# Altium footprint library IC_SMD_QUAD.PCBLIB: 80 footprints (part 2 of 5)
Each footprint in its own frame and in the unit in brackets; x right, y up, seen from the top. Pads: shape width x height; smd on the part's side, far side on the other; paste and mask are expansions set on the pad; w line width, h text height; cw(c..) or ccw(c..) is an arc to the next point about the centre after c.
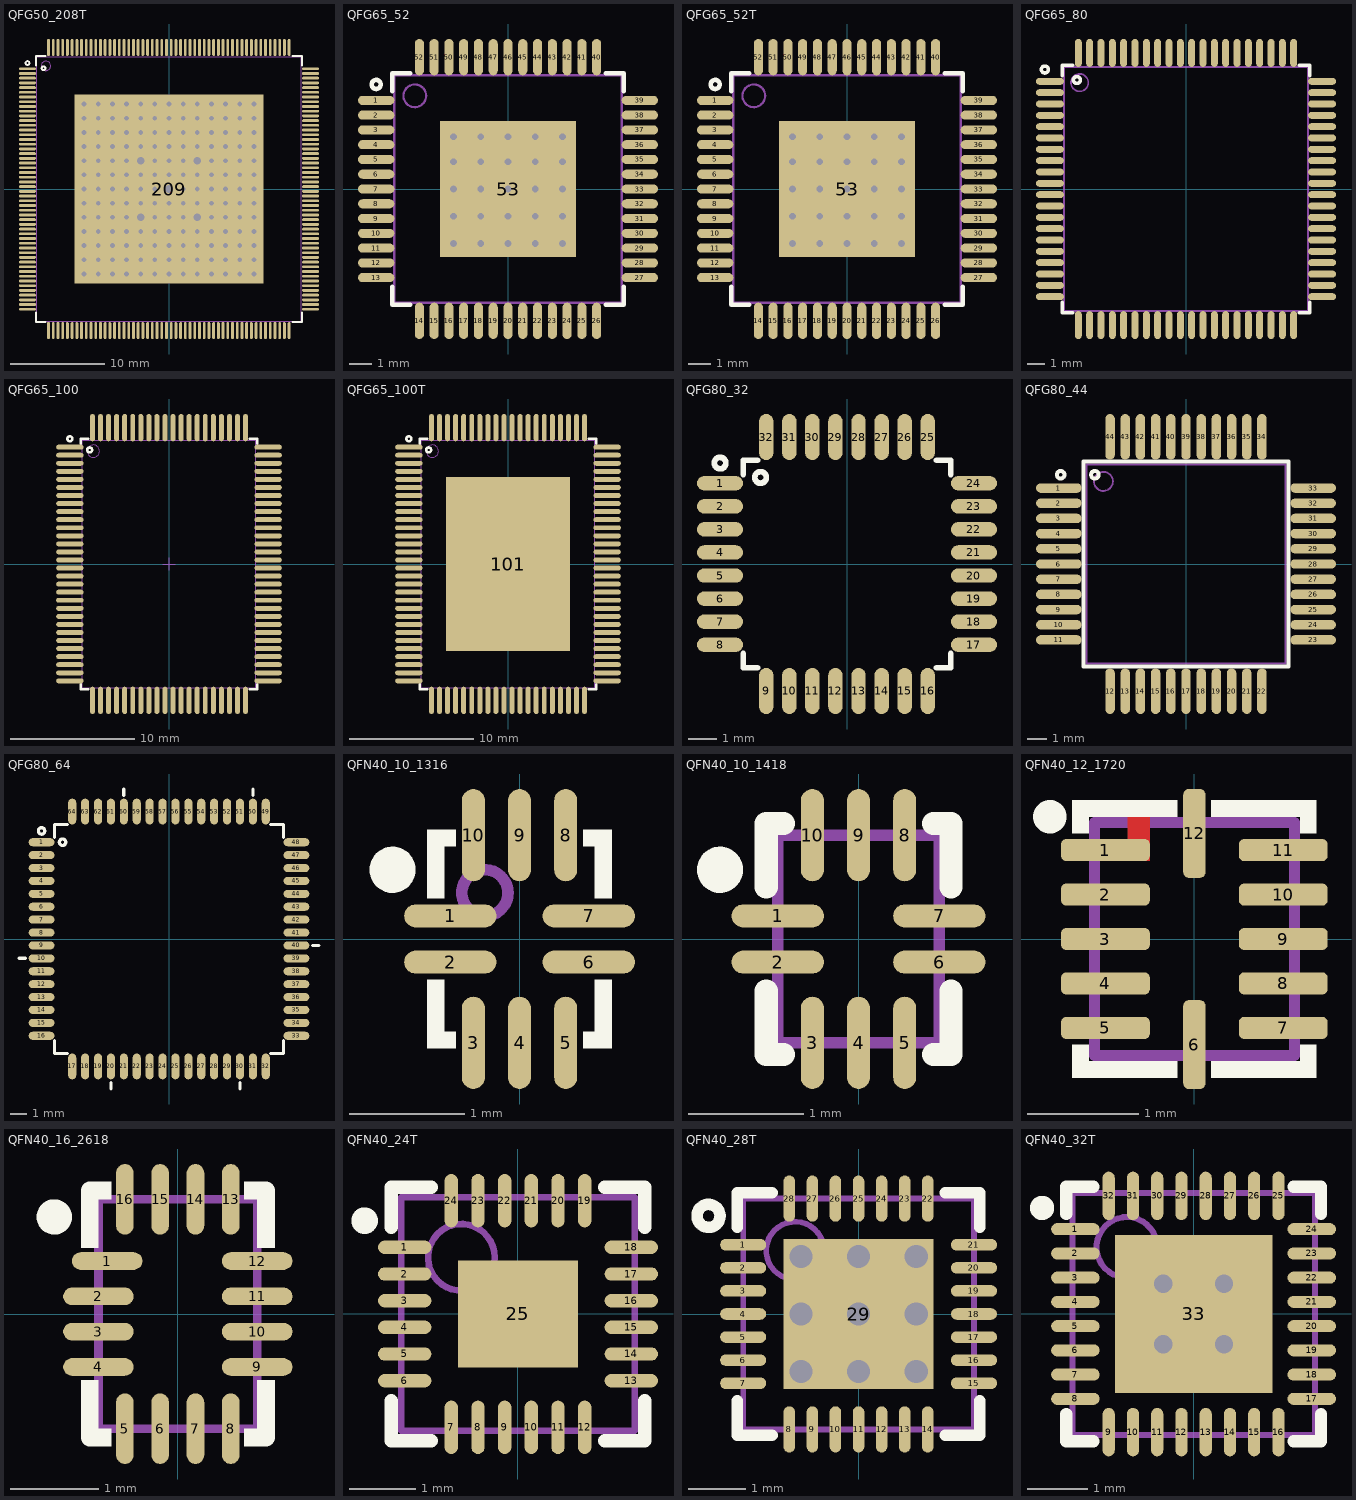
[diagram p1: the footprints below, top view; thin cyan lines are the x and y axes]

## QFG50_208T [mm] "LQFP208p, PYP, HQ208, MS-026(JEDEC), 28X28mm, ptich: 0.5mm"
pads (209):
  oval 1.8x0.3 smd mask+0.075: 1(-15,12.75) 2(-15,12.25) 3(-15,11.75) 4(-15,11.25) 5(-15,10.75) 6(-15,10.25) 7(-15,9.75) 8(-15,9.25) 9(-15,8.75) 10(-15,8.25) 11(-15,7.75) 12(-15,7.25) 13(-15,6.75) 14(-15,6.25) 15(-15,5.75) 16(-15,5.25) 17(-15,4.75) 18(-15,4.25) 19(-15,3.75) 20(-15,3.25) 21(-15,2.75) 22(-15,2.25) 23(-15,1.75) 24(-15,1.25) 25(-15,0.75) 26(-15,0.25) 27(-15,-0.25) 28(-15,-0.75) 29(-15,-1.25) 30(-15,-1.75) 31(-15,-2.25) 32(-15,-2.75) 33(-15,-3.25) 34(-15,-3.75) 35(-15,-4.25) 36(-15,-4.75) 37(-15,-5.25) 38(-15,-5.75) 39(-15,-6.25) 40(-15,-6.75) 41(-15,-7.25) 42(-15,-7.75) 43(-15,-8.25) 44(-15,-8.75) 45(-15,-9.25) 46(-15,-9.75) 47(-15,-10.25) 48(-15,-10.75) 49(-15,-11.25) 50(-15,-11.75) 51(-15,-12.25) 52(-15,-12.75) 105(15,-12.75) 106(15,-12.25) 107(15,-11.75) 108(15,-11.25) 109(15,-10.75) 110(15,-10.25) 111(15,-9.75) 112(15,-9.25) 113(15,-8.75) 114(15,-8.25) 115(15,-7.75) 116(15,-7.25) 117(15,-6.75) 118(15,-6.25) 119(15,-5.75) 120(15,-5.25) 121(15,-4.75) 122(15,-4.25) 123(15,-3.75) 124(15,-3.25) 125(15,-2.75) 126(15,-2.25) 127(15,-1.75) 128(15,-1.25) 129(15,-0.75) 130(15,-0.25) 131(15,0.25) 132(15,0.75) 133(15,1.25) 134(15,1.75) 135(15,2.25) 136(15,2.75) 137(15,3.25) 138(15,3.75) 139(15,4.25) 140(15,4.75) 141(15,5.25) 142(15,5.75) 143(15,6.25) 144(15,6.75) 145(15,7.25) 146(15,7.75) 147(15,8.25) 148(15,8.75) 149(15,9.25) 150(15,9.75) 151(15,10.25) 152(15,10.75) 153(15,11.25) 154(15,11.75) 155(15,12.25) 156(15,12.75)
  oval 0.3x1.8 smd mask+0.075: 53(-12.769,-15) 54(-12.269,-15) 55(-11.769,-15) 56(-11.269,-15) 57(-10.769,-15) 58(-10.269,-15) 59(-9.769,-15) 60(-9.269,-15) 61(-8.769,-15) 62(-8.269,-15) 63(-7.769,-15) 64(-7.269,-15) 65(-6.769,-15) 66(-6.269,-15) 67(-5.769,-15) 68(-5.269,-15) 69(-4.769,-15) 70(-4.269,-15) 71(-3.769,-15) 72(-3.269,-15) 73(-2.769,-15) 74(-2.269,-15) 75(-1.769,-15) 76(-1.269,-15) 77(-0.769,-15) 78(-0.269,-15) 79(0.231,-15) 80(0.731,-15) 81(1.231,-15) 82(1.731,-15) 83(2.231,-15) 84(2.731,-15) 85(3.231,-15) 86(3.731,-15) 87(4.231,-15) 88(4.731,-15) 89(5.231,-15) 90(5.731,-15) 91(6.231,-15) 92(6.731,-15) 93(7.231,-15) 94(7.731,-15) 95(8.231,-15) 96(8.731,-15) 97(9.231,-15) 98(9.731,-15) 99(10.231,-15) 100(10.731,-15) 101(11.231,-15) 102(11.731,-15) 103(12.231,-15) 104(12.731,-15) 157(12.731,15) 158(12.231,15) 159(11.731,15) 160(11.231,15) 161(10.731,15) 162(10.231,15) 163(9.731,15) 164(9.231,15) 165(8.731,15) 166(8.231,15) 167(7.731,15) 168(7.231,15) 169(6.731,15) 170(6.231,15) 171(5.731,15) 172(5.231,15) 173(4.731,15) 174(4.231,15) 175(3.731,15) 176(3.231,15) 177(2.731,15) 178(2.231,15) 179(1.731,15) 180(1.231,15) 181(0.731,15) 182(0.231,15) 183(-0.269,15) 184(-0.769,15) 185(-1.269,15) 186(-1.769,15) 187(-2.269,15) 188(-2.769,15) 189(-3.269,15) 190(-3.769,15) 191(-4.269,15) 192(-4.769,15) 193(-5.269,15) 194(-5.769,15) 195(-6.269,15) 196(-6.769,15) 197(-7.269,15) 198(-7.769,15) 199(-8.269,15) 200(-8.769,15) 201(-9.269,15) 202(-9.769,15) 203(-10.269,15) 204(-10.769,15) 205(-11.269,15) 206(-11.769,15) 207(-12.269,15) 208(-12.769,15)
  rect 20x20 smd mask+0.1: 209(0,0)
via -6,-3 diameter 0.8 hole 0.5
via -6,-4.5 diameter 0.8 hole 0.5
via -9,-3 diameter 0.8 hole 0.5
via -7.5,-3 diameter 0.8 hole 0.5
via -9,-4.5 diameter 0.8 hole 0.5
via -7.5,-4.5 diameter 0.8 hole 0.5
via -7.5,-1.5 diameter 0.8 hole 0.5
via -9,-1.5 diameter 0.8 hole 0.5
via -7.5,0 diameter 0.8 hole 0.5
via -9,0 diameter 0.8 hole 0.5
via -7.5,3 diameter 0.8 hole 0.5
via -9,3 diameter 0.8 hole 0.5
via -7.5,1.5 diameter 0.8 hole 0.5
via -7.5,4.5 diameter 0.8 hole 0.5
via -9,4.5 diameter 0.8 hole 0.5
via -9,1.5 diameter 0.8 hole 0.5
via -6,3 diameter 0.8 hole 0.5
via -6,4.5 diameter 0.8 hole 0.5
via -6,-1.5 diameter 0.8 hole 0.5
via -6,1.5 diameter 0.8 hole 0.5
via -6,0 diameter 0.8 hole 0.5
via -6,6 diameter 0.8 hole 0.5
via -6,9 diameter 0.8 hole 0.5
via -6,7.5 diameter 0.8 hole 0.5
via -9,6 diameter 0.8 hole 0.5
via -9,9 diameter 0.8 hole 0.5
via -7.5,9 diameter 0.8 hole 0.5
via -7.5,6 diameter 0.8 hole 0.5
via -9,7.5 diameter 0.8 hole 0.5
via -7.5,7.5 diameter 0.8 hole 0.5
via -6,-6 diameter 0.8 hole 0.5
via -6,-9 diameter 0.8 hole 0.5
via -6,-7.5 diameter 0.8 hole 0.5
via -9,-6 diameter 0.8 hole 0.5
via -9,-9 diameter 0.8 hole 0.5
via -7.5,-9 diameter 0.8 hole 0.5
via -7.5,-6 diameter 0.8 hole 0.5
via -9,-7.5 diameter 0.8 hole 0.5
via -7.5,-7.5 diameter 0.8 hole 0.5
via 6,-3 diameter 0.8 hole 0.5
via 6,-4.5 diameter 0.8 hole 0.5
via 9,-3 diameter 0.8 hole 0.5
via 7.5,-3 diameter 0.8 hole 0.5
via 9,-4.5 diameter 0.8 hole 0.5
via 7.5,-4.5 diameter 0.8 hole 0.5
via 7.5,-1.5 diameter 0.8 hole 0.5
via 9,-1.5 diameter 0.8 hole 0.5
via 7.5,0 diameter 0.8 hole 0.5
via 9,0 diameter 0.8 hole 0.5
via 7.5,3 diameter 0.8 hole 0.5
via 9,3 diameter 0.8 hole 0.5
via 7.5,1.5 diameter 0.8 hole 0.5
via 7.5,4.5 diameter 0.8 hole 0.5
via 9,4.5 diameter 0.8 hole 0.5
via 9,1.5 diameter 0.8 hole 0.5
via 6,3 diameter 0.8 hole 0.5
via 6,4.5 diameter 0.8 hole 0.5
via 6,-1.5 diameter 0.8 hole 0.5
via 6,1.5 diameter 0.8 hole 0.5
via 6,0 diameter 0.8 hole 0.5
via 6,6 diameter 0.8 hole 0.5
via 6,9 diameter 0.8 hole 0.5
via 6,7.5 diameter 0.8 hole 0.5
via 9,6 diameter 0.8 hole 0.5
via 9,9 diameter 0.8 hole 0.5
via 7.5,9 diameter 0.8 hole 0.5
via 7.5,6 diameter 0.8 hole 0.5
via 9,7.5 diameter 0.8 hole 0.5
via 7.5,7.5 diameter 0.8 hole 0.5
via 6,-6 diameter 0.8 hole 0.5
via 6,-9 diameter 0.8 hole 0.5
via 6,-7.5 diameter 0.8 hole 0.5
via 9,-6 diameter 0.8 hole 0.5
via 9,-9 diameter 0.8 hole 0.5
via 7.5,-9 diameter 0.8 hole 0.5
via 7.5,-6 diameter 0.8 hole 0.5
via 9,-7.5 diameter 0.8 hole 0.5
via 7.5,-7.5 diameter 0.8 hole 0.5
via 3,-7.5 diameter 0.8 hole 0.5
via 4.5,-7.5 diameter 0.8 hole 0.5
via 3,-6 diameter 0.8 hole 0.5
via 3,-9 diameter 0.8 hole 0.5
via 4.5,-9 diameter 0.8 hole 0.5
via 4.5,-6 diameter 0.8 hole 0.5
via -3,-7.5 diameter 0.8 hole 0.5
via -4.5,-7.5 diameter 0.8 hole 0.5
via -3,-6 diameter 0.8 hole 0.5
via -3,-9 diameter 0.8 hole 0.5
via -4.5,-9 diameter 0.8 hole 0.5
via -4.5,-6 diameter 0.8 hole 0.5
via 0,-7.5 diameter 0.8 hole 0.5
via 0,-9 diameter 0.8 hole 0.5
via -1.5,-7.5 diameter 0.8 hole 0.5
via 1.5,-7.5 diameter 0.8 hole 0.5
via 1.5,-9 diameter 0.8 hole 0.5
via -1.5,-9 diameter 0.8 hole 0.5
via -1.5,-6 diameter 0.8 hole 0.5
via 1.5,-6 diameter 0.8 hole 0.5
via 0,-6 diameter 0.8 hole 0.5
via 3,7.5 diameter 0.8 hole 0.5
via 4.5,7.5 diameter 0.8 hole 0.5
via 3,6 diameter 0.8 hole 0.5
via 3,9 diameter 0.8 hole 0.5
via 4.5,9 diameter 0.8 hole 0.5
via 4.5,6 diameter 0.8 hole 0.5
via -3,7.5 diameter 0.8 hole 0.5
via -4.5,7.5 diameter 0.8 hole 0.5
via -3,6 diameter 0.8 hole 0.5
via -3,9 diameter 0.8 hole 0.5
via -4.5,9 diameter 0.8 hole 0.5
via -4.5,6 diameter 0.8 hole 0.5
via 0,7.5 diameter 0.8 hole 0.5
via 0,9 diameter 0.8 hole 0.5
via -1.5,7.5 diameter 0.8 hole 0.5
via 1.5,7.5 diameter 0.8 hole 0.5
via 1.5,9 diameter 0.8 hole 0.5
via -1.5,9 diameter 0.8 hole 0.5
via -1.5,6 diameter 0.8 hole 0.5
via 1.5,6 diameter 0.8 hole 0.5
via 0,6 diameter 0.8 hole 0.5
via 0,0 diameter 1.2 hole 0.8
via 0,1.5 diameter 0.8 hole 0.5
via -1.5,0 diameter 0.8 hole 0.5
via 0,-1.5 diameter 0.8 hole 0.5
via 1.5,0 diameter 0.8 hole 0.5
via 1.5,1.5 diameter 0.8 hole 0.5
via -1.5,1.5 diameter 0.8 hole 0.5
via -1.5,-1.5 diameter 0.8 hole 0.5
via 1.5,-1.5 diameter 0.8 hole 0.5
via -1.5,4.5 diameter 0.8 hole 0.5
via 1.5,4.5 diameter 0.8 hole 0.5
via 1.5,3 diameter 0.8 hole 0.5
via -1.5,3 diameter 0.8 hole 0.5
via 0,4.5 diameter 0.8 hole 0.5
via 0,3 diameter 0.8 hole 0.5
via -4.5,1.5 diameter 0.8 hole 0.5
via -4.5,4.5 diameter 0.8 hole 0.5
via -3,4.5 diameter 0.8 hole 0.5
via -3,1.5 diameter 0.8 hole 0.5
via -4.5,3 diameter 0.8 hole 0.5
via -3,3 diameter 1.2 hole 0.8
via -4.5,0 diameter 0.8 hole 0.5
via -3,0 diameter 0.8 hole 0.5
via -4.5,-1.5 diameter 0.8 hole 0.5
via -3,-1.5 diameter 0.8 hole 0.5
via 4.5,1.5 diameter 0.8 hole 0.5
via 4.5,4.5 diameter 0.8 hole 0.5
via 3,4.5 diameter 0.8 hole 0.5
via 3,1.5 diameter 0.8 hole 0.5
via 4.5,3 diameter 0.8 hole 0.5
via 3,3 diameter 1.2 hole 0.8
via 4.5,0 diameter 0.8 hole 0.5
via 3,0 diameter 0.8 hole 0.5
via 4.5,-1.5 diameter 0.8 hole 0.5
via 3,-1.5 diameter 0.8 hole 0.5
via 3,-4.5 diameter 0.8 hole 0.5
via 4.5,-4.5 diameter 0.8 hole 0.5
via 3,-3 diameter 1.2 hole 0.8
via 4.5,-3 diameter 0.8 hole 0.5
via -3,-4.5 diameter 0.8 hole 0.5
via -4.5,-4.5 diameter 0.8 hole 0.5
via -3,-3 diameter 1.2 hole 0.8
via -4.5,-3 diameter 0.8 hole 0.5
via 1.5,-4.5 diameter 0.8 hole 0.5
via -1.5,-4.5 diameter 0.8 hole 0.5
via 1.5,-3 diameter 0.8 hole 0.5
via 0,-4.5 diameter 0.8 hole 0.5
via -1.5,-3 diameter 0.8 hole 0.5
via 0,-3 diameter 0.8 hole 0.5
TopOverlay:
  circle w0.2: c-15,13.349 r0.2
  circle w0.2: c-13.3,12.8 r0.2
  lines w0.2: -14.1,-13.1 -14.1,-14.1 -13.1,-14.1 ; -14.1,13.1 -14.1,14.1 -13.1,14.1 ; 13.1,-14.1 14.1,-14.1 14.1,-13.1 ; 13.1,14.1 14.1,14.1 14.1,13.1
TopSolder:
  drawing of 169 lines, arcs and shapes, not listed
Mechanical13:
  circle w0.1: c-13.05,13.05 r0.5
  lines w0.1: -14,-14 -14,14 14,14 14,-14 -14,-14
3D body: height 1.6, standoff 0.05, extent -14,-14 14,14

## QFG65_52 [mm] "MQFP52, S-52-2 (analog-Device), MO-112-AC-1(JEDEC), 52-Leads, Body 10x10mm, Pitch 0.65mm"
height 1.6
pads (53):
  oval 1.6x0.4 smd mask+0.075: 1(-5.8,3.9) 2(-5.8,3.25) 3(-5.8,2.6) 4(-5.8,1.95) 5(-5.8,1.3) 6(-5.8,0.65) 7(-5.8,0) 8(-5.8,-0.65) 9(-5.8,-1.3) 10(-5.8,-1.95) 11(-5.8,-2.6) 12(-5.8,-3.25) 13(-5.8,-3.9) 27(5.8,-3.9) 28(5.8,-3.25) 29(5.8,-2.6) 30(5.8,-1.95) 31(5.8,-1.3) 32(5.8,-0.65) 33(5.8,0) 34(5.8,0.65) 35(5.8,1.3) 36(5.8,1.95) 37(5.8,2.6) 38(5.8,3.25) 39(5.8,3.9)
  oval 0.4x1.6 smd mask+0.075: 14(-3.9,-5.8) 15(-3.25,-5.8) 16(-2.6,-5.8) 17(-1.95,-5.8) 18(-1.3,-5.8) 19(-0.65,-5.8) 20(0,-5.8) 21(0.65,-5.8) 22(1.3,-5.8) 23(1.95,-5.8) 24(2.6,-5.8) 25(3.25,-5.8) 26(3.9,-5.8) 40(3.9,5.8) 41(3.25,5.8) 42(2.6,5.8) 43(1.95,5.8) 44(1.3,5.8) 45(0.65,5.8) 46(0,5.8) 47(-0.65,5.8) 48(-1.3,5.8) 49(-1.95,5.8) 50(-2.6,5.8) 51(-3.25,5.8) 52(-3.9,5.8)
  rect 6x6 smd: 53(0,0)
via 2.4,-2.4 diameter 0.5 hole 0.3
via 1.2,-2.4 diameter 0.5 hole 0.3
via 0,-2.4 diameter 0.5 hole 0.3
via -1.2,-2.4 diameter 0.5 hole 0.3
via -2.4,-2.4 diameter 0.5 hole 0.3
via 2.4,-1.2 diameter 0.5 hole 0.3
via 1.2,-1.2 diameter 0.5 hole 0.3
via 0,-1.2 diameter 0.5 hole 0.3
via -1.2,-1.2 diameter 0.5 hole 0.3
via -2.4,-1.2 diameter 0.5 hole 0.3
via 2.4,0 diameter 0.5 hole 0.3
via 1.2,0 diameter 0.5 hole 0.3
via 0,0 diameter 0.5 hole 0.3
via -1.2,0 diameter 0.5 hole 0.3
via -2.4,0 diameter 0.5 hole 0.3
via 2.4,1.2 diameter 0.5 hole 0.3
via 1.2,1.2 diameter 0.5 hole 0.3
via 0,1.2 diameter 0.5 hole 0.3
via -1.2,1.2 diameter 0.5 hole 0.3
via -2.4,1.2 diameter 0.5 hole 0.3
via 2.4,2.3 diameter 0.5 hole 0.3
via 1.2,2.3 diameter 0.5 hole 0.3
via 0,2.3 diameter 0.5 hole 0.3
via -1.2,2.3 diameter 0.5 hole 0.3
via -2.4,2.3 diameter 0.5 hole 0.3
TopOverlay:
  circle w0.2: c-5.8,4.6 r0.2
  lines w0.2: -5.1,-4.3 -5.1,-5.1 -4.3,-5.1 ; -5.1,4.3 -5.1,5.1 -4.3,5.1 ; 4.3,-5.1 5.1,-5.1 5.1,-4.3 ; 4.3,5.1 5.1,5.1 5.1,4.3
Mechanical13:
  circle w0.1: c-4.1,4.1 r0.5
  lines w0.1: -5,-5 5,-5 5,5 -5,5 -5,-5
Mechanical15:
  lines w0.1: -0.5,0 0.5,0 ; 0,-0.5 0,0.5
3D body "QFP127P600-8N.step": height 1.6, standoff 0, extent -6,-6 6,6

## QFG65_52T [mm] "LQFP, TQFP, 52-Leads, Body 10x10mm, Pitch 0.65mm"
height 1.6
pads (53):
  oval 1.6x0.4 smd mask+0.075: 1(-5.8,3.9) 2(-5.8,3.25) 3(-5.8,2.6) 4(-5.8,1.95) 5(-5.8,1.3) 6(-5.8,0.65) 7(-5.8,0) 8(-5.8,-0.65) 9(-5.8,-1.3) 10(-5.8,-1.95) 11(-5.8,-2.6) 12(-5.8,-3.25) 13(-5.8,-3.9) 27(5.8,-3.9) 28(5.8,-3.25) 29(5.8,-2.6) 30(5.8,-1.95) 31(5.8,-1.3) 32(5.8,-0.65) 33(5.8,0) 34(5.8,0.65) 35(5.8,1.3) 36(5.8,1.95) 37(5.8,2.6) 38(5.8,3.25) 39(5.8,3.9)
  oval 0.4x1.6 smd mask+0.075: 14(-3.9,-5.8) 15(-3.25,-5.8) 16(-2.6,-5.8) 17(-1.95,-5.8) 18(-1.3,-5.8) 19(-0.65,-5.8) 20(0,-5.8) 21(0.65,-5.8) 22(1.3,-5.8) 23(1.95,-5.8) 24(2.6,-5.8) 25(3.25,-5.8) 26(3.9,-5.8) 40(3.9,5.8) 41(3.25,5.8) 42(2.6,5.8) 43(1.95,5.8) 44(1.3,5.8) 45(0.65,5.8) 46(0,5.8) 47(-0.65,5.8) 48(-1.3,5.8) 49(-1.95,5.8) 50(-2.6,5.8) 51(-3.25,5.8) 52(-3.9,5.8)
  rect 6x6 smd: 53(0,0)
via 2.4,-2.4 diameter 0.5 hole 0.3
via 1.2,-2.4 diameter 0.5 hole 0.3
via 0,-2.4 diameter 0.5 hole 0.3
via -1.2,-2.4 diameter 0.5 hole 0.3
via -2.4,-2.4 diameter 0.5 hole 0.3
via 2.4,-1.2 diameter 0.5 hole 0.3
via 1.2,-1.2 diameter 0.5 hole 0.3
via 0,-1.2 diameter 0.5 hole 0.3
via -1.2,-1.2 diameter 0.5 hole 0.3
via -2.4,-1.2 diameter 0.5 hole 0.3
via 2.4,0 diameter 0.5 hole 0.3
via 1.2,0 diameter 0.5 hole 0.3
via 0,0 diameter 0.5 hole 0.3
via -1.2,0 diameter 0.5 hole 0.3
via -2.4,0 diameter 0.5 hole 0.3
via 2.4,1.2 diameter 0.5 hole 0.3
via 1.2,1.2 diameter 0.5 hole 0.3
via 0,1.2 diameter 0.5 hole 0.3
via -1.2,1.2 diameter 0.5 hole 0.3
via -2.4,1.2 diameter 0.5 hole 0.3
via 2.4,2.3 diameter 0.5 hole 0.3
via 1.2,2.3 diameter 0.5 hole 0.3
via 0,2.3 diameter 0.5 hole 0.3
via -1.2,2.3 diameter 0.5 hole 0.3
via -2.4,2.3 diameter 0.5 hole 0.3
TopOverlay:
  circle w0.2: c-5.8,4.6 r0.2
  lines w0.2: -5.1,-4.3 -5.1,-5.1 -4.3,-5.1 ; -5.1,4.3 -5.1,5.1 -4.3,5.1 ; 4.3,-5.1 5.1,-5.1 5.1,-4.3 ; 4.3,5.1 5.1,5.1 5.1,4.3
Mechanical13:
  circle w0.1: c-4.1,4.1 r0.5
  lines w0.1: -5,-5 5,-5 5,5 -5,5 -5,-5
Mechanical15:
  lines w0.1: -0.5,0 0.5,0 ; 0,-0.5 0,0.5
3D body "QFP127P600-8N.step": height 1.6, standoff 0, extent -6,-6 6,6

## QFG65_80 [mm] "QFP, 80-Leads, Body 14x14mm (max), Pitch 0.65mm"
height 3
pads (80):
  oval 1.6x0.4 smd mask+0.075: 1(-7.8,6.175) 2(-7.8,5.525) 3(-7.8,4.875) 4(-7.8,4.225) 5(-7.8,3.575) 6(-7.8,2.925) 7(-7.8,2.275) 8(-7.8,1.625) 9(-7.8,0.975) 10(-7.8,0.325) 11(-7.8,-0.325) 12(-7.8,-0.975) 13(-7.8,-1.625) 14(-7.8,-2.275) 15(-7.8,-2.925) 16(-7.8,-3.575) 17(-7.8,-4.225) 18(-7.8,-4.875) 19(-7.8,-5.525) 20(-7.8,-6.175) 41(7.8,-6.175) 42(7.8,-5.525) 43(7.8,-4.875) 44(7.8,-4.225) 45(7.8,-3.575) 46(7.8,-2.925) 47(7.8,-2.275) 48(7.8,-1.625) 49(7.8,-0.975) 50(7.8,-0.325) 51(7.8,0.325) 52(7.8,0.975) 53(7.8,1.625) 54(7.8,2.275) 55(7.8,2.925) 56(7.8,3.575) 57(7.8,4.225) 58(7.8,4.875) 59(7.8,5.525) 60(7.8,6.175)
  oval 0.4x1.6 smd mask+0.075: 21(-6.175,-7.8) 22(-5.525,-7.8) 23(-4.875,-7.8) 24(-4.225,-7.8) 25(-3.575,-7.8) 26(-2.925,-7.8) 27(-2.275,-7.8) 28(-1.625,-7.8) 29(-0.975,-7.8) 30(-0.325,-7.8) 31(0.325,-7.8) 32(0.975,-7.8) 33(1.625,-7.8) 34(2.275,-7.8) 35(2.925,-7.8) 36(3.575,-7.8) 37(4.225,-7.8) 38(4.875,-7.8) 39(5.525,-7.8) 40(6.175,-7.8) 61(6.175,7.8) 62(5.525,7.8) 63(4.875,7.8) 64(4.225,7.8) 65(3.575,7.8) 66(2.925,7.8) 67(2.275,7.8) 68(1.625,7.8) 69(0.975,7.8) 70(0.325,7.8) 71(-0.325,7.8) 72(-0.975,7.8) 73(-1.625,7.8) 74(-2.275,7.8) 75(-2.925,7.8) 76(-3.575,7.8) 77(-4.225,7.8) 78(-4.875,7.8) 79(-5.525,7.8) 80(-6.175,7.8)
TopOverlay:
  circle w0.2: c-6.257,6.25 r0.2
  circle w0.2: c-8.1,6.849 r0.2
  lines w0.2: -7.1,-6.5 -7.1,-7.1 -6.5,-7.1 ; -7.1,6.5 -7.1,7.1 -6.5,7.1 ; 6.5,-7.1 7.1,-7.1 7.1,-6.5 ; 6.5,7.1 7.1,7.1 7.1,6.5
Mechanical13:
  circle w0.1: c-6.1,6.1 r0.5
  lines w0.1: -7,-7 -7,7 7,7 7,-7 -7,-7
3D body "QFG65_80-.step": height 1.2, standoff 0, extent -8,-8 8,8

## QFG65_100 [mm] "PQ100, MS-022-GC1(JEDEC), QFP100, 20X14, 0.65mm"
pads (100):
  oval 2.2x0.4 smd mask+0.075: 1(-8,9.425) 2(-8,8.775) 3(-8,8.125) 4(-8,7.475) 5(-8,6.825) 6(-8,6.175) 7(-8,5.525) 8(-8,4.875) 9(-8,4.225) 10(-8,3.575) 11(-8,2.925) 12(-8,2.275) 13(-8,1.625) 14(-8,0.975) 15(-8,0.325) 16(-8,-0.325) 17(-8,-0.975) 18(-8,-1.625) 19(-8,-2.275) 20(-8,-2.925) 21(-8,-3.575) 22(-8,-4.225) 23(-8,-4.875) 24(-8,-5.525) 25(-8,-6.175) 26(-8,-6.825) 27(-8,-7.475) 28(-8,-8.125) 29(-8,-8.775) 30(-8,-9.425) 51(8,-9.425) 52(8,-8.775) 53(8,-8.125) 54(8,-7.475) 55(8,-6.825) 56(8,-6.175) 57(8,-5.525) 58(8,-4.875) 59(8,-4.225) 60(8,-3.575) 61(8,-2.925) 62(8,-2.275) 63(8,-1.625) 64(8,-0.975) 65(8,-0.325) 66(8,0.325) 67(8,0.975) 68(8,1.625) 69(8,2.275) 70(8,2.925) 71(8,3.575) 72(8,4.225) 73(8,4.875) 74(8,5.525) 75(8,6.175) 76(8,6.825) 77(8,7.475) 78(8,8.125) 79(8,8.775) 80(8,9.425)
  oval 0.4x2.2 smd mask+0.075: 31(-6.175,-11) 32(-5.525,-11) 33(-4.875,-11) 34(-4.225,-11) 35(-3.575,-11) 36(-2.925,-11) 37(-2.275,-11) 38(-1.625,-11) 39(-0.975,-11) 40(-0.325,-11) 41(0.325,-11) 42(0.975,-11) 43(1.625,-11) 44(2.275,-11) 45(2.925,-11) 46(3.575,-11) 47(4.225,-11) 48(4.875,-11) 49(5.525,-11) 50(6.175,-11) 81(6.175,11) 82(5.525,11) 83(4.875,11) 84(4.225,11) 85(3.575,11) 86(2.925,11) 87(2.275,11) 88(1.625,11) 89(0.975,11) 90(0.325,11) 91(-0.325,11) 92(-0.975,11) 93(-1.625,11) 94(-2.275,11) 95(-2.925,11) 96(-3.575,11) 97(-4.225,11) 98(-4.875,11) 99(-5.525,11) 100(-6.175,11)
TopOverlay:
  circle w0.2: c-6.4,9.2 r0.2
  circle w0.2: c-8,10.1 r0.2
  lines w0.2: -7.1,-9.7 -7.1,-10.1 -6.5,-10.1 ; -7.1,9.7 -7.1,10.1 -6.5,10.1 ; 6.5,-10.1 7.1,-10.1 7.1,-9.7 ; 6.5,10.1 7.1,10.1 7.1,9.7
Mechanical13:
  circle w0.1: c-6.1,9.1 r0.5
  lines w0.1: -7,-10 7,-10 7,10 -7,10 -7,-10
Mechanical15:
  lines w0.1: -0.5,0 0.5,0 ; 0,-0.5 0,0.5
3D body "QFP127P600-8N.step": height 2.4, standoff 0, extent -8.5,-11.5 8.5,11.5

## QFG65_100T [mm] "HQ100, 20X14, 0.65mm"
pads (101):
  oval 2.2x0.4 smd mask+0.075: 1(-8,9.425) 2(-8,8.775) 3(-8,8.125) 4(-8,7.475) 5(-8,6.825) 6(-8,6.175) 7(-8,5.525) 8(-8,4.875) 9(-8,4.225) 10(-8,3.575) 11(-8,2.925) 12(-8,2.275) 13(-8,1.625) 14(-8,0.975) 15(-8,0.325) 16(-8,-0.325) 17(-8,-0.975) 18(-8,-1.625) 19(-8,-2.275) 20(-8,-2.925) 21(-8,-3.575) 22(-8,-4.225) 23(-8,-4.875) 24(-8,-5.525) 25(-8,-6.175) 26(-8,-6.825) 27(-8,-7.475) 28(-8,-8.125) 29(-8,-8.775) 30(-8,-9.425) 51(8,-9.425) 52(8,-8.775) 53(8,-8.125) 54(8,-7.475) 55(8,-6.825) 56(8,-6.175) 57(8,-5.525) 58(8,-4.875) 59(8,-4.225) 60(8,-3.575) 61(8,-2.925) 62(8,-2.275) 63(8,-1.625) 64(8,-0.975) 65(8,-0.325) 66(8,0.325) 67(8,0.975) 68(8,1.625) 69(8,2.275) 70(8,2.925) 71(8,3.575) 72(8,4.225) 73(8,4.875) 74(8,5.525) 75(8,6.175) 76(8,6.825) 77(8,7.475) 78(8,8.125) 79(8,8.775) 80(8,9.425)
  oval 0.4x2.2 smd mask+0.075: 31(-6.175,-11) 32(-5.525,-11) 33(-4.875,-11) 34(-4.225,-11) 35(-3.575,-11) 36(-2.925,-11) 37(-2.275,-11) 38(-1.625,-11) 39(-0.975,-11) 40(-0.325,-11) 41(0.325,-11) 42(0.975,-11) 43(1.625,-11) 44(2.275,-11) 45(2.925,-11) 46(3.575,-11) 47(4.225,-11) 48(4.875,-11) 49(5.525,-11) 50(6.175,-11) 81(6.175,11) 82(5.525,11) 83(4.875,11) 84(4.225,11) 85(3.575,11) 86(2.925,11) 87(2.275,11) 88(1.625,11) 89(0.975,11) 90(0.325,11) 91(-0.325,11) 92(-0.975,11) 93(-1.625,11) 94(-2.275,11) 95(-2.925,11) 96(-3.575,11) 97(-4.225,11) 98(-4.875,11) 99(-5.525,11) 100(-6.175,11)
  rect 10x14 smd mask+0.075: 101(0,0)
TopOverlay:
  circle w0.2: c-8,10.1 r0.2
  circle w0.2: c-6.4,9.2 r0.2
  lines w0.2: -7.1,-9.7 -7.1,-10.1 -6.5,-10.1 ; -7.1,9.7 -7.1,10.1 -6.5,10.1 ; 6.5,-10.1 7.1,-10.1 7.1,-9.7 ; 6.5,10.1 7.1,10.1 7.1,9.7
Mechanical13:
  circle w0.1: c-6.1,9.1 r0.5
  lines w0.1: -7,-10 -7,10 7,10 7,-10 -7,-10
Mechanical15:
  lines w0.1: -0.5,0 0.5,0 ; 0,-0.5 0,0.5
3D body "QFP127P600-8N.step": height 2.4, standoff 0, extent -8.5,-11.5 8.5,11.5

## QFG80_32 [mm] "TQFP32, A32 (Cypress), GP32 (Zarlink), MS-026ABA(JEDEC), 7X7mm, 0.8mm"
pads (32):
  oval 1.6x0.5 smd: 1(-4.4,2.8) 2(-4.4,2) 3(-4.4,1.2) 4(-4.4,0.4) 5(-4.4,-0.4) 6(-4.4,-1.2) 7(-4.4,-2) 8(-4.4,-2.8) 17(4.4,-2.8) 18(4.4,-2) 19(4.4,-1.2) 20(4.4,-0.4) 21(4.4,0.4) 22(4.4,1.2) 23(4.4,2) 24(4.4,2.8)
  oval 0.5x1.6 smd: 9(-2.8,-4.4) 10(-2,-4.4) 11(-1.2,-4.4) 12(-0.4,-4.4) 13(0.4,-4.4) 14(1.2,-4.4) 15(2,-4.4) 16(2.8,-4.4) 25(2.8,4.4) 26(2,4.4) 27(1.2,4.4) 28(0.4,4.4) 29(-0.4,4.4) 30(-1.2,4.4) 31(-2,4.4) 32(-2.8,4.4)
TopOverlay:
  circle w0.2: c-4.4,3.5 r0.2
  circle w0.2: c-3,3 r0.2
  lines w0.2: -3.6,-3.1 -3.6,-3.6 -3.1,-3.6 ; -3.6,3.1 -3.6,3.6 -3.1,3.6 ; 3.1,-3.6 3.6,-3.6 3.6,-3.1 ; 3.1,3.6 3.6,3.6 3.6,3.1
3D body "User Library-QFP32.STEP": height 1.6, standoff -0.05, extent -4.5,-4.5 4.5,4.5

## QFG80_44 [mm] "TQFP44, PQFP44, A44 (Cypress), QFP44/MQFP44N (Dallas), VQ44,VQG44 (Xilinx), MS-026ACB, MS-022AB(JEDEC), 44A, 10.5X10.5, 0.8mm"
height 2.3
pads (44):
  oval 2.4x0.5 smd mask+0.075: 1(-6.7,4) 2(-6.7,3.2) 3(-6.7,2.4) 4(-6.7,1.6) 5(-6.7,0.8) 6(-6.7,0) 7(-6.7,-0.8) 8(-6.7,-1.6) 9(-6.7,-2.4) 10(-6.7,-3.2) 11(-6.7,-4) 23(6.7,-4) 24(6.7,-3.2) 25(6.7,-2.4) 26(6.7,-1.6) 27(6.7,-0.8) 28(6.7,0) 29(6.7,0.8) 30(6.7,1.6) 31(6.7,2.4) 32(6.7,3.2) 33(6.7,4)
  oval 0.5x2.4 smd mask+0.075: 12(-4,-6.7) 13(-3.2,-6.7) 14(-2.4,-6.7) 15(-1.6,-6.7) 16(-0.8,-6.7) 17(0,-6.7) 18(0.8,-6.7) 19(1.6,-6.7) 20(2.4,-6.7) 21(3.2,-6.7) 22(4,-6.7) 34(4,6.7) 35(3.2,6.7) 36(2.4,6.7) 37(1.6,6.7) 38(0.8,6.7) 39(0,6.7) 40(-0.8,6.7) 41(-1.6,6.7) 42(-2.4,6.7) 43(-3.2,6.7) 44(-4,6.7)
TopOverlay:
  circle w0.2: c-4.8,4.7 r0.2
  circle w0.2: c-6.6,4.7 r0.2
  lines w0.2: -5.4,-5.4 5.4,-5.4 5.4,5.4 -5.4,5.4 -5.4,-5.4
Mechanical13:
  circle w0.1: c-4.35,4.35 r0.5
  lines w0.1: -5.25,-5.25 5.25,-5.25 5.25,5.25 -5.25,5.25 -5.25,-5.25
3D body "QFG80_44.step": height 2.3, standoff 0, extent -7.25,-7.25 7.25,7.25

## QFG80_64 [mm] "TQFP64, N65 (Cypress), , MS-026 AEB(JEDEC), 64A (atmel), 14X14mm, 0.8mm"
pads (64):
  oval 1.6x0.5 smd: 1(-7.9,6) 2(-7.9,5.2) 3(-7.9,4.4) 4(-7.9,3.6) 5(-7.9,2.8) 6(-7.9,2) 7(-7.9,1.2) 8(-7.9,0.4) 9(-7.9,-0.4) 10(-7.9,-1.2) 11(-7.9,-2) 12(-7.9,-2.8) 13(-7.9,-3.6) 14(-7.9,-4.4) 15(-7.9,-5.2) 16(-7.9,-6) 33(7.9,-6) 34(7.9,-5.2) 35(7.9,-4.4) 36(7.9,-3.6) 37(7.9,-2.8) 38(7.9,-2) 39(7.9,-1.2) 40(7.9,-0.4) 41(7.9,0.4) 42(7.9,1.2) 43(7.9,2) 44(7.9,2.8) 45(7.9,3.6) 46(7.9,4.4) 47(7.9,5.2) 48(7.9,6)
  oval 0.5x1.6 smd: 17(-6,-7.9) 18(-5.2,-7.9) 19(-4.4,-7.9) 20(-3.6,-7.9) 21(-2.8,-7.9) 22(-2,-7.9) 23(-1.2,-7.9) 24(-0.4,-7.9) 25(0.4,-7.9) 26(1.2,-7.9) 27(2,-7.9) 28(2.8,-7.9) 29(3.6,-7.9) 30(4.4,-7.9) 31(5.2,-7.9) 32(6,-7.9) 49(6,7.9) 50(5.2,7.9) 51(4.4,7.9) 52(3.6,7.9) 53(2.8,7.9) 54(2,7.9) 55(1.2,7.9) 56(0.4,7.9) 57(-0.4,7.9) 58(-1.2,7.9) 59(-2,7.9) 60(-2.8,7.9) 61(-3.6,7.9) 62(-4.4,7.9) 63(-5.2,7.9) 64(-6,7.9)
TopOverlay:
  circle w0.2: c-7.9,6.7 r0.2
  circle w0.2: c-6.6,6 r0.2
  lines w0.2: -9.3,-1.2 -8.9,-1.2 ; -7.1,-6.3 -7.1,-7.1 -6.3,-7.1 ; -7.1,6.3 -7.1,7.1 -6.3,7.1 ; -3.6,-9.3 -3.6,-8.9 ; -2.8,8.9 -2.8,9.3 ; 4.4,-9.3 4.4,-8.9 ; 5.2,8.9 5.2,9.3 ; 6.3,-7.1 7.1,-7.1 7.1,-6.3 ; 6.3,7.1 7.1,7.1 7.1,6.3 ; 8.9,-0.4 9.3,-0.4
3D body "User Library-atmega64 (tqfp64).step": height 1.1, standoff -0.01, extent -8,-8 8,8

## QFN40_10_1316 [mm] "QFN, 10, 1.3X1.6mm, 0.4mm, LFCSP, CP-10-10"
height 0.5
pads (10):
  oval 0.8x0.2 smd mask+0.05: 1(-0.6,0.2) 2(-0.6,-0.2) 6(0.6,-0.2) 7(0.6,0.2)
  oval 0.2x0.8 smd mask+0.05: 3(-0.4,-0.9) 4(0,-0.9) 5(0.4,-0.9) 8(0.4,0.9) 9(0,0.9) 10(-0.4,0.9)
TopOverlay:
  circle w0.2: c-1.1,0.6 r0.1
  region: 0.8,0.95 0.65,0.95 0.65,0.35 0.8,0.35
  region: 0.8,0.95 0.55,0.95 0.55,0.8 0.8,0.8
  region: 0.8,-0.8 0.55,-0.8 0.55,-0.95 0.8,-0.95
  region: 0.8,-0.35 0.65,-0.35 0.65,-0.95 0.8,-0.95
  rectangle: -0.8,-0.95 -0.65,-0.35
  rectangle: -0.8,-0.95 -0.55,-0.8
  rectangle: -0.8,0.8 -0.55,0.95
  rectangle: -0.8,0.35 -0.65,0.95
Mechanical13:
  circle w0.1: c-0.3,0.4 r0.2
3D body "User Library-LFCSP-10.step": height 0.55, standoff 0, extent -0.65,-0.8 0.65,0.8

## QFN40_10_1418 [mm] "PUQFN-10 RSW 1.8X1.4mm, 0.4mm pitch"
height 0.55
pads (10):
  oval 0.8x0.2 smd mask+0.05: 1(-0.7,0.2) 2(-0.7,-0.2) 6(0.7,-0.2) 7(0.7,0.2)
  oval 0.2x0.8 smd mask+0.05: 3(-0.4,-0.9) 4(0,-0.9) 5(0.4,-0.9) 8(0.4,0.9) 9(0,0.9) 10(-0.4,0.9)
TopOverlay:
  circle w0.2: c-1.2,0.6 r0.1
  lines w0.2: -0.8,-0.45 -0.8,-1 -0.65,-1 ; -0.8,0.45 -0.8,1 -0.65,1 ; 0.65,-1 0.8,-1 0.8,-0.45 ; 0.65,1 0.8,1 0.8,0.45
Mechanical13:
  lines w0.1: -0.7,-0.9 -0.7,0.9 0.7,0.9 0.7,-0.9 -0.7,-0.9
3D body "QFN40_10_140X180.step": height 0.55, standoff 0, extent -0.701,-0.901 0.701,0.901

## QFN40_12_1720 [mm] "UQFN-12, pitch: 0.4mm, 1.7x2x0.5mm"
height 0.55
pads (12):
  rrect50% 0.8x0.2 smd mask+0.05: 1(-0.8,0.8) 2(-0.8,0.4) 3(-0.8,0) 4(-0.8,-0.4) 5(-0.8,-0.8) 7(0.8,-0.8) 8(0.8,-0.4) 9(0.8,0) 10(0.8,0.4) 11(0.8,0.8)
  rrect50% 0.2x0.8 smd mask+0.05: 6(0,-0.95) 12(0,0.95)
TopLayer:
  rectangle: -0.6,0.7 -0.4,1.1
TopOverlay:
  circle w0.2: c-1.3,1.1 r0.05
  rectangle: -1.1,-1.25 -0.15,-1.1
  rectangle: -1.1,-1.25 -0.95,-0.95
  region: 1.1,-0.95 0.95,-0.95 0.95,-1.25 1.1,-1.25
  region: 1.1,-1.1 0.15,-1.1 0.15,-1.25 1.1,-1.25
  region: 1.1,1.25 0.15,1.25 0.15,1.1 1.1,1.1
  region: 1.1,1.25 0.95,1.25 0.95,0.95 1.1,0.95
  rectangle: -1.1,0.95 -0.95,1.25
  rectangle: -1.1,1.1 -0.15,1.25
TopSolder:
  rectangle: -0.65,0.65 -0.35,1.1
Mechanical13:
  lines w0.1: -0.9,-1.05 0.9,-1.05 0.9,1.05 -0.9,1.05 -0.9,-1.05
3D body "QFN40_12_170X200.step": height 0.55, standoff 0, extent -0.901,-1.051 0.901,1.051

## QFN40_16_2618 [mm] "PUQFN-16 RSV 2.6X1.8mm, 0.4mm pitch"
height 0.55
pads (16):
  oval 0.8x0.2 smd mask+0.05: 1(-0.8,0.6) 2(-0.9,0.2) 3(-0.9,-0.2) 4(-0.9,-0.6) 9(0.9,-0.6) 10(0.9,-0.2) 11(0.9,0.2) 12(0.9,0.6)
  oval 0.2x0.8 smd mask+0.05: 5(-0.6,-1.3) 6(-0.2,-1.3) 7(0.2,-1.3) 8(0.6,-1.3) 13(0.6,1.3) 14(0.2,1.3) 15(-0.2,1.3) 16(-0.6,1.3)
TopOverlay:
  circle w0.2: c-1.4,1.1 r0.1
  rectangle: -0.9,1.3 -0.75,1.5
  region: -1.1,0.9 -1.1,0.75 -0.9,0.75 -0.9,0.9
  region: 0.9,0.9 0.9,0.75 1.1,0.75 1.1,0.9
  region: 0.9,1.5 0.75,1.5 0.75,1.3 0.9,1.3
  region: 0.9,-1.3 0.75,-1.3 0.75,-1.5 0.9,-1.5
  region: 1.1,-0.9 1.1,-0.75 0.9,-0.75 0.9,-0.9
  region: -0.9,-0.9 -0.9,-0.75 -1.1,-0.75 -1.1,-0.9
  rectangle: -0.9,-1.5 -0.75,-1.3
  lines w0.2: -1,-0.85 -1,-1.4 -0.9,-1.4 ; -1,0.85 -1,1.4 -0.9,1.4 ; 0.9,-1.4 1,-1.4 1,-0.85 ; 0.9,1.4 1,1.4 1,0.85
Mechanical13:
  lines w0.1: -0.9,-1.3 -0.9,1.3 0.9,1.3 0.9,-1.3 -0.9,-1.3
3D body "QFN40_16_260X180.step": height 0.55, standoff 0, extent -0.901,-1.301 0.901,1.301

## QFN40_24T [mm] "QFN, 24-Leads, Body 3.5x3.5mm, Pitch 0.40mm"
height 1
pads (25):
  oval 0.8x0.2 smd mask+0.05: 1(-1.7,1) 2(-1.7,0.6) 3(-1.7,0.2) 4(-1.7,-0.2) 5(-1.7,-0.6) 6(-1.7,-1) 13(1.7,-1) 14(1.7,-0.6) 15(1.7,-0.2) 16(1.7,0.2) 17(1.7,0.6) 18(1.7,1)
  oval 0.2x0.8 smd mask+0.05: 7(-1,-1.7) 8(-0.6,-1.7) 9(-0.2,-1.7) 10(0.2,-1.7) 11(0.6,-1.7) 12(1,-1.7) 19(1,1.7) 20(0.6,1.7) 21(0.2,1.7) 22(-0.2,1.7) 23(-0.6,1.7) 24(-1,1.7)
  rect 1.8x1.6 smd: 25(0,0)
TopOverlay:
  circle w0.2: c-2.3,1.4 r0.1
  lines w0.2: -1.9,-1.3 -1.9,-1.9 -1.3,-1.9 ; -1.9,1.3 -1.9,1.9 -1.3,1.9 ; 1.3,-1.9 1.9,-1.9 1.9,-1.3 ; 1.3,1.9 1.9,1.9 1.9,1.3
Mechanical13:
  circle w0.1: c-0.85,0.85 r0.5
  lines w0.1: -1.75,-1.75 1.75,-1.75 1.75,1.75 -1.75,1.75 -1.75,-1.75
3D body "QFN40_24T.step": height 1, standoff 0, extent -1.76,-1.76 1.76,1.76

## QFN40_28T [mm] "QFN28, 0.4mm pitch, 4x4mm, MLPQ-UT28"
height 0.6
pads (29):
  oval 0.8x0.2 smd mask+0.05: 1(-2,1.2) 2(-2,0.8) 3(-2,0.4) 4(-2,0) 5(-2,-0.4) 6(-2,-0.8) 7(-2,-1.2) 15(2,-1.2) 16(2,-0.8) 17(2,-0.4) 18(2,0) 19(2,0.4) 20(2,0.8) 21(2,1.2)
  oval 0.2x0.8 smd mask+0.05: 8(-1.2,-2) 9(-0.8,-2) 10(-0.4,-2) 11(0,-2) 12(0.4,-2) 13(0.8,-2) 14(1.2,-2) 22(1.2,2) 23(0.8,2) 24(0.4,2) 25(0,2) 26(-0.4,2) 27(-0.8,2) 28(-1.2,2)
  rect 2.6x2.6 smd mask+0.05: 29(0,0)
via 1,-1 diameter 0.6 hole 0.4
via 0,-1 diameter 0.6 hole 0.4
via -1,-1 diameter 0.6 hole 0.4
via -1,1 diameter 0.6 hole 0.4
via 0,1 diameter 0.6 hole 0.4
via 1,1 diameter 0.6 hole 0.4
via 1,0 diameter 0.6 hole 0.4
via -1,0 diameter 0.6 hole 0.4
via 0,0 diameter 0.6 hole 0.4
TopOverlay:
  circle w0.2: c-2.6,1.7 r0.2
  lines w0.2: -2.1,-1.5 -2.1,-2.1 -1.5,-2.1 ; -2.1,1.5 -2.1,2.1 -1.5,2.1 ; 1.5,-2.1 2.1,-2.1 2.1,-1.5 ; 1.5,2.1 2.1,2.1 2.1,1.5
Mechanical13:
  circle w0.1: c-1.1,1.1 r0.5
  lines w0.1: -2,-2 -2,2 2,2 2,-2 -2,-2
3D body "QFN40_28T.step": height 0.6, standoff 0, extent -2.001,-2.001 2.001,2.001

## QFN40_32T [mm] "QFN, 32M3, 32-Leads, Body 4x4mm, Pitch 0.40mm"
height 0.9
pads (33):
  oval 0.8x0.2 smd mask+0.05: 1(-1.95,1.4) 2(-1.95,1) 3(-1.95,0.6) 4(-1.95,0.2) 5(-1.95,-0.2) 6(-1.95,-0.6) 7(-1.95,-1) 8(-1.95,-1.4) 17(1.95,-1.4) 18(1.95,-1) 19(1.95,-0.6) 20(1.95,-0.2) 21(1.95,0.2) 22(1.95,0.6) 23(1.95,1) 24(1.95,1.4)
  oval 0.2x0.8 smd mask+0.05: 9(-1.4,-1.95) 10(-1,-1.95) 11(-0.6,-1.95) 12(-0.2,-1.95) 13(0.2,-1.95) 14(0.6,-1.95) 15(1,-1.95) 16(1.4,-1.95) 25(1.4,1.95) 26(1,1.95) 27(0.6,1.95) 28(0.2,1.95) 29(-0.2,1.95) 30(-0.6,1.95) 31(-1,1.95) 32(-1.4,1.95)
  rect 2.6x2.6 smd mask+0.1: 33(0,0)
via -0.5,-0.5 diameter 0.5 hole 0.3
via 0.5,-0.5 diameter 0.5 hole 0.3
via 0.5,0.5 diameter 0.5 hole 0.3
via -0.5,0.5 diameter 0.5 hole 0.3
TopOverlay:
  circle w0.2: c-2.5,1.75 r0.1
  lines w0.2: -2.1,-1.65 -2.1,-2.1 -1.65,-2.1 ; -2.1,1.65 -2.1,2.1 -1.65,2.1 ; 1.65,-2.1 2.1,-2.1 2.1,-1.65 ; 1.65,2.1 2.1,2.1 2.1,1.65
Mechanical13:
  circle w0.1: c-1.1,1.1 r0.5
  lines w0.1: -2,-2 2,-2 2,2 -2,2 -2,-2
3D body "QFN40_32T.step": height 0.9, standoff 0, extent -2.001,-2.001 2.001,2.001